# Altium schematic symbol library jlcpcb_2025_04_capacitors_extended_0805.schlib: 3281 symbols (part 5 of 18)
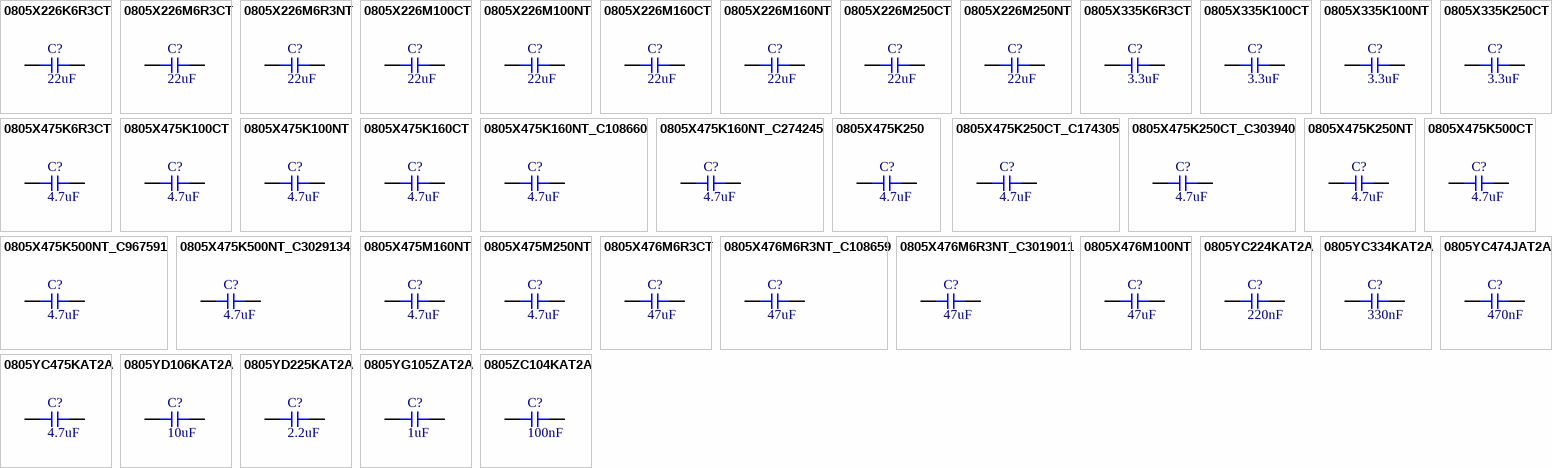
[diagram p86: symbols 0805X226K6R3CT to 0805ZC104KAT2A]

## 0805ZC104KAT2A
designator C?  Capacitance: 100nF  (hidden comment: *)
Capacitor, Ceramic (MLCC), 100nF, ±10%, 10V, X7R, ±10%, SMD 0805; Manufacturer: AVX; Manufacturer Part Number: 0805ZC104KAT2A; Package Size: 0805; JLCPCB Basic Part: No; JLCPCB Part Number: C597440; Supplier 1: LCSC; Category: Capacitors - MLCC; Supplier Part Number 1: C597440; Tolerance: ±10%; Voltage Rating: 10V; Temperature Coefficient: X7R; RoHS: Yes; ComponentLink1Description: Datasheet; ComponentLink1URL: https://wmsc.lcsc.com/wmsc/upload/file/pdf/v2/lcsc/2304140030_Kyocera-AVX-0805ZC104KAT2A_C597440.pdf; ComponentLink2Description: JLCPCB Part URL; ComponentLink2URL: https://jlcpcb.com/partdetail/C597440; ComponentLink3Description: LCSC Part URL; ComponentLink3URL: https://lcsc.com/product-detail/Multilayer-Ceramic-Capacitors-MLCC---SMD-SMT_Kyocera-AVX-Kyocera-AVX-0805ZC104KAT2A_C597440.html
footprint CAP-0805 (0805 (2012M) Capacitor)
pins: 1, 2

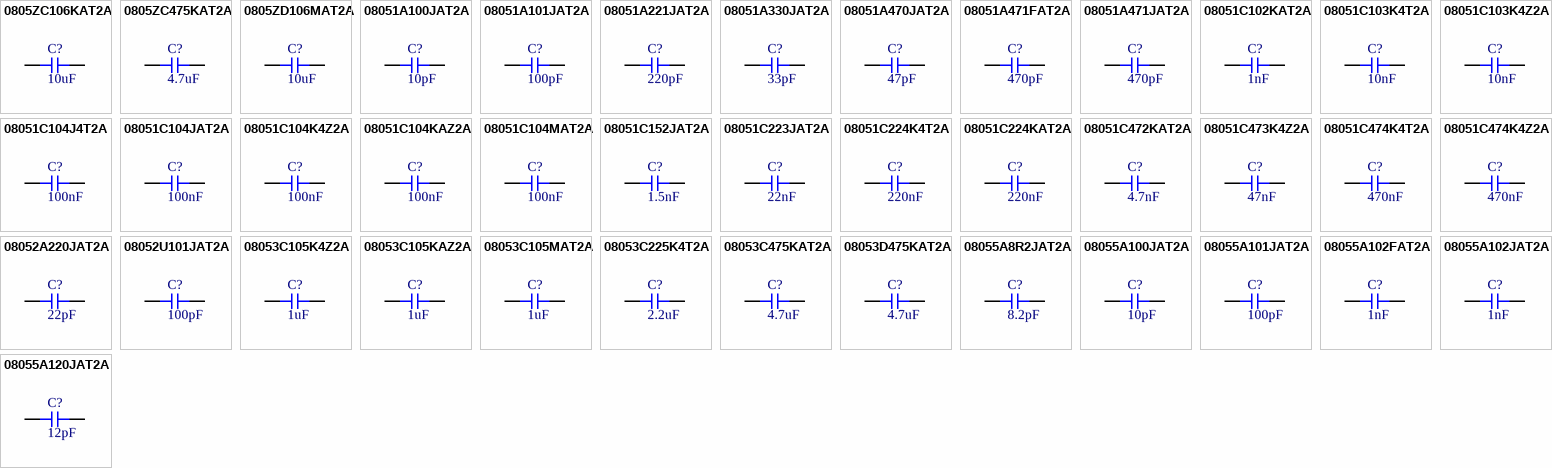
[diagram p18: symbols 0805ZC106KAT2A to 08055A120JAT2A]

## 0805ZC106KAT2A
designator C?  Capacitance: 10uF  (hidden comment: *)
Capacitor, Ceramic (MLCC), 10uF, ±10%, 10V, X7R, ±10%, SMD 0805; Manufacturer: AVX; Manufacturer Part Number: 0805ZC106KAT2A; Package Size: 0805; JLCPCB Basic Part: No; JLCPCB Part Number: C597442; Supplier 1: LCSC; Category: Capacitors - MLCC; Supplier Part Number 1: C597442; Tolerance: ±10%; Voltage Rating: 10V; Temperature Coefficient: X7R; RoHS: Yes; ComponentLink1Description: Datasheet; ComponentLink1URL: https://wmsc.lcsc.com/wmsc/upload/file/pdf/v2/lcsc/2304140030_Kyocera-AVX-0805ZC106KAT2A_C597442.pdf; ComponentLink2Description: JLCPCB Part URL; ComponentLink2URL: https://jlcpcb.com/partdetail/C597442; ComponentLink3Description: LCSC Part URL; ComponentLink3URL: https://lcsc.com/product-detail/Multilayer-Ceramic-Capacitors-MLCC---SMD-SMT_Kyocera-AVX-Kyocera-AVX-0805ZC106KAT2A_C597442.html
footprint CAP-0805 (0805 (2012M) Capacitor)
pins: 1, 2

## 0805ZC475KAT2A
designator C?  Capacitance: 4.7uF  (hidden comment: *)
Capacitor, Ceramic (MLCC), 4.7uF, ±10%, 10V, X7R, ±10%, SMD 0805; Manufacturer: Kyocera AVX; Manufacturer Part Number: 0805ZC475KAT2A; Package Size: 0805; JLCPCB Basic Part: No; JLCPCB Part Number: C2167587; Supplier 1: LCSC; Category: Capacitors - MLCC; Supplier Part Number 1: C2167587; Tolerance: ±10%; Voltage Rating: 10V; Temperature Coefficient: X7R; RoHS: Yes; ComponentLink1Description: Datasheet; ComponentLink1URL: https://wmsc.lcsc.com/wmsc/upload/file/pdf/v2/lcsc/2304140030_Kyocera-AVX-0805ZC475KAT2A_C2167587.pdf; ComponentLink2Description: JLCPCB Part URL; ComponentLink2URL: https://jlcpcb.com/partdetail/C2167587; ComponentLink3Description: LCSC Part URL; ComponentLink3URL: https://lcsc.com/product-detail/Multilayer-Ceramic-Capacitors-MLCC---SMD-SMT_Kyocera-AVX-Kyocera-AVX-0805ZC475KAT2A_C2167587.html
footprint CAP-0805 (0805 (2012M) Capacitor)
pins: 1, 2

## 0805ZD106MAT2A
designator C?  Capacitance: 10uF  (hidden comment: *)
Capacitor, Ceramic (MLCC), 10uF, ±20%, 10V, X5R, ±20%, SMD 0805; Manufacturer: Kyocera AVX; Manufacturer Part Number: 0805ZD106MAT2A; Package Size: 0805; JLCPCB Basic Part: No; JLCPCB Part Number: C2170995; Supplier 1: LCSC; Category: Capacitors - MLCC; Supplier Part Number 1: C2170995; Tolerance: ±20%; Voltage Rating: 10V; Temperature Coefficient: X5R; RoHS: Yes; ComponentLink1Description: Datasheet; ComponentLink1URL: https://wmsc.lcsc.com/wmsc/upload/file/pdf/v2/lcsc/2304140030_Kyocera-AVX-0805ZD106MAT2A_C2170995.pdf; ComponentLink2Description: JLCPCB Part URL; ComponentLink2URL: https://jlcpcb.com/partdetail/C2170995; ComponentLink3Description: LCSC Part URL; ComponentLink3URL: https://lcsc.com/product-detail/Multilayer-Ceramic-Capacitors-MLCC---SMD-SMT_Kyocera-AVX-Kyocera-AVX-0805ZD106MAT2A_C2170995.html
footprint CAP-0805 (0805 (2012M) Capacitor)
pins: 1, 2

## 08051A100JAT2A
designator C?  Capacitance: 10pF  (hidden comment: *)
Capacitor, Ceramic (MLCC), 10pF, ±5%, 100V, C0G, ±5%, SMD 0805; Manufacturer: AVX; Manufacturer Part Number: 08051A100JAT2A; Package Size: 0805; JLCPCB Basic Part: No; JLCPCB Part Number: C597259; Supplier 1: LCSC; Category: Capacitors - MLCC; Supplier Part Number 1: C597259; Tolerance: ±5%; Voltage Rating: 100V; Temperature Coefficient: C0G; RoHS: Yes; ComponentLink1Description: Datasheet; ComponentLink1URL: https://wmsc.lcsc.com/wmsc/upload/file/pdf/v2/lcsc/2304140030_Kyocera-AVX-08051A100JAT2A_C597259.pdf; ComponentLink2Description: JLCPCB Part URL; ComponentLink2URL: https://jlcpcb.com/partdetail/C597259; ComponentLink3Description: LCSC Part URL; ComponentLink3URL: https://lcsc.com/product-detail/Multilayer-Ceramic-Capacitors-MLCC---SMD-SMT_Kyocera-AVX-Kyocera-AVX-08051A100JAT2A_C597259.html
footprint CAP-0805 (0805 (2012M) Capacitor)
pins: 1, 2

## 08051A101JAT2A
designator C?  Capacitance: 100pF  (hidden comment: *)
Capacitor, Ceramic (MLCC), 100pF, ±5%, 100V, C0G, ±5%, SMD 0805; Manufacturer: AVX; Manufacturer Part Number: 08051A101JAT2A; Package Size: 0805; JLCPCB Basic Part: No; JLCPCB Part Number: C597261; Supplier 1: LCSC; Category: Capacitors - MLCC; Supplier Part Number 1: C597261; Tolerance: ±5%; Voltage Rating: 100V; Temperature Coefficient: C0G; RoHS: Yes; ComponentLink1Description: Datasheet; ComponentLink1URL: https://wmsc.lcsc.com/wmsc/upload/file/pdf/v2/lcsc/2304140030_Kyocera-AVX-08051A101JAT2A_C597261.pdf; ComponentLink2Description: JLCPCB Part URL; ComponentLink2URL: https://jlcpcb.com/partdetail/C597261; ComponentLink3Description: LCSC Part URL; ComponentLink3URL: https://lcsc.com/product-detail/Multilayer-Ceramic-Capacitors-MLCC---SMD-SMT_Kyocera-AVX-Kyocera-AVX-08051A101JAT2A_C597261.html
footprint CAP-0805 (0805 (2012M) Capacitor)
pins: 1, 2

## 08051A221JAT2A
designator C?  Capacitance: 220pF  (hidden comment: *)
Capacitor, Ceramic (MLCC), 220pF, ±5%, 100V, C0G, ±5%, SMD 0805; Manufacturer: AVX; Manufacturer Part Number: 08051A221JAT2A; Package Size: 0805; JLCPCB Basic Part: No; JLCPCB Part Number: C597269; Supplier 1: LCSC; Category: Capacitors - MLCC; Supplier Part Number 1: C597269; Tolerance: ±5%; Voltage Rating: 100V; Temperature Coefficient: C0G; RoHS: Yes; ComponentLink1Description: Datasheet; ComponentLink1URL: https://wmsc.lcsc.com/wmsc/upload/file/pdf/v2/lcsc/2304140030_Kyocera-AVX-08051A221JAT2A_C597269.pdf; ComponentLink2Description: JLCPCB Part URL; ComponentLink2URL: https://jlcpcb.com/partdetail/C597269; ComponentLink3Description: LCSC Part URL; ComponentLink3URL: https://lcsc.com/product-detail/Multilayer-Ceramic-Capacitors-MLCC---SMD-SMT_Kyocera-AVX-Kyocera-AVX-08051A221JAT2A_C597269.html
footprint CAP-0805 (0805 (2012M) Capacitor)
pins: 1, 2

## 08051A330JAT2A
designator C?  Capacitance: 33pF  (hidden comment: *)
Capacitor, Ceramic (MLCC), 33pF, ±5%, 100V, C0G, ±5%, SMD 0805; Manufacturer: AVX; Manufacturer Part Number: 08051A330JAT2A; Package Size: 0805; JLCPCB Basic Part: No; JLCPCB Part Number: C597273; Supplier 1: LCSC; Category: Capacitors - MLCC; Supplier Part Number 1: C597273; Tolerance: ±5%; Voltage Rating: 100V; Temperature Coefficient: C0G; RoHS: Yes; ComponentLink1Description: Datasheet; ComponentLink1URL: https://wmsc.lcsc.com/wmsc/upload/file/pdf/v2/lcsc/2304140030_Kyocera-AVX-08051A330JAT2A_C597273.pdf; ComponentLink2Description: JLCPCB Part URL; ComponentLink2URL: https://jlcpcb.com/partdetail/C597273; ComponentLink3Description: LCSC Part URL; ComponentLink3URL: https://lcsc.com/product-detail/Multilayer-Ceramic-Capacitors-MLCC---SMD-SMT_Kyocera-AVX-Kyocera-AVX-08051A330JAT2A_C597273.html
footprint CAP-0805 (0805 (2012M) Capacitor)
pins: 1, 2

## 08051A470JAT2A
designator C?  Capacitance: 47pF  (hidden comment: *)
Capacitor, Ceramic (MLCC), 47pF, ±5%, 100V, C0G, ±5%, SMD 0805; Manufacturer: AVX; Manufacturer Part Number: 08051A470JAT2A; Package Size: 0805; JLCPCB Basic Part: No; JLCPCB Part Number: C597277; Supplier 1: LCSC; Category: Capacitors - MLCC; Supplier Part Number 1: C597277; Tolerance: ±5%; Voltage Rating: 100V; Temperature Coefficient: C0G; RoHS: Yes; ComponentLink1Description: Datasheet; ComponentLink1URL: https://wmsc.lcsc.com/wmsc/upload/file/pdf/v2/lcsc/2304140030_Kyocera-AVX-08051A470JAT2A_C597277.pdf; ComponentLink2Description: JLCPCB Part URL; ComponentLink2URL: https://jlcpcb.com/partdetail/C597277; ComponentLink3Description: LCSC Part URL; ComponentLink3URL: https://lcsc.com/product-detail/Multilayer-Ceramic-Capacitors-MLCC---SMD-SMT_Kyocera-AVX-Kyocera-AVX-08051A470JAT2A_C597277.html
footprint CAP-0805 (0805 (2012M) Capacitor)
pins: 1, 2

## 08051A471FAT2A
designator C?  Capacitance: 470pF  (hidden comment: *)
Capacitor, Ceramic (MLCC), 470pF, ±1%, 100V, C0G, ±1%, SMD 0805; Manufacturer: Kyocera AVX; Manufacturer Part Number: 08051A471FAT2A; Package Size: 0805; JLCPCB Basic Part: No; JLCPCB Part Number: C2167779; Supplier 1: LCSC; Category: Capacitors - MLCC; Supplier Part Number 1: C2167779; Tolerance: ±1%; Voltage Rating: 100V; Temperature Coefficient: C0G; RoHS: Yes; ComponentLink1Description: Datasheet; ComponentLink1URL: https://wmsc.lcsc.com/wmsc/upload/file/pdf/v2/lcsc/2304140030_Kyocera-AVX-08051A471FAT2A_C2167779.pdf; ComponentLink2Description: JLCPCB Part URL; ComponentLink2URL: https://jlcpcb.com/partdetail/C2167779; ComponentLink3Description: LCSC Part URL; ComponentLink3URL: https://lcsc.com/product-detail/Multilayer-Ceramic-Capacitors-MLCC---SMD-SMT_Kyocera-AVX-Kyocera-AVX-08051A471FAT2A_C2167779.html
footprint CAP-0805 (0805 (2012M) Capacitor)
pins: 1, 2

## 08051A471JAT2A
designator C?  Capacitance: 470pF  (hidden comment: *)
Capacitor, Ceramic (MLCC), 470pF, ±5%, 100V, C0G, ±5%, SMD 0805; Manufacturer: AVX; Manufacturer Part Number: 08051A471JAT2A; Package Size: 0805; JLCPCB Basic Part: No; JLCPCB Part Number: C597278; Supplier 1: LCSC; Category: Capacitors - MLCC; Supplier Part Number 1: C597278; Tolerance: ±5%; Voltage Rating: 100V; Temperature Coefficient: C0G; RoHS: Yes; ComponentLink1Description: Datasheet; ComponentLink1URL: https://wmsc.lcsc.com/wmsc/upload/file/pdf/v2/lcsc/2304140030_Kyocera-AVX-08051A471JAT2A_C597278.pdf; ComponentLink2Description: JLCPCB Part URL; ComponentLink2URL: https://jlcpcb.com/partdetail/C597278; ComponentLink3Description: LCSC Part URL; ComponentLink3URL: https://lcsc.com/product-detail/Multilayer-Ceramic-Capacitors-MLCC---SMD-SMT_Kyocera-AVX-Kyocera-AVX-08051A471JAT2A_C597278.html
footprint CAP-0805 (0805 (2012M) Capacitor)
pins: 1, 2

## 08051C102KAT2A
designator C?  Capacitance: 1nF  (hidden comment: *)
Capacitor, Ceramic (MLCC), 1nF, ±10%, 100V, X7R, ±10%, SMD 0805; Manufacturer: AVX; Manufacturer Part Number: 08051C102KAT2A; Package Size: 0805; JLCPCB Basic Part: No; JLCPCB Part Number: C597284; Supplier 1: LCSC; Category: Capacitors - MLCC; Supplier Part Number 1: C597284; Tolerance: ±10%; Voltage Rating: 100V; Temperature Coefficient: X7R; RoHS: Yes; ComponentLink1Description: Datasheet; ComponentLink1URL: https://wmsc.lcsc.com/wmsc/upload/file/pdf/v2/lcsc/2304140030_Kyocera-AVX-08051C102KAT2A_C597284.pdf; ComponentLink2Description: JLCPCB Part URL; ComponentLink2URL: https://jlcpcb.com/partdetail/C597284; ComponentLink3Description: LCSC Part URL; ComponentLink3URL: https://lcsc.com/product-detail/Multilayer-Ceramic-Capacitors-MLCC---SMD-SMT_Kyocera-AVX-Kyocera-AVX-08051C102KAT2A_C597284.html
footprint CAP-0805 (0805 (2012M) Capacitor)
pins: 1, 2

## 08051C103K4T2A
designator C?  Capacitance: 10nF  (hidden comment: *)
Capacitor, Ceramic (MLCC), 10nF, ±10%, 100V, X7R, ±10%, SMD 0805; Manufacturer: AVX; Manufacturer Part Number: 08051C103K4T2A; Package Size: 0805; JLCPCB Basic Part: No; JLCPCB Part Number: C779976; Supplier 1: LCSC; Category: Capacitors - MLCC; Supplier Part Number 1: C779976; Tolerance: ±10%; Voltage Rating: 100V; Temperature Coefficient: X7R; RoHS: Yes; ComponentLink1Description: Datasheet; ComponentLink1URL: https://wmsc.lcsc.com/wmsc/upload/file/pdf/v2/lcsc/2304140030_Kyocera-AVX-08051C103K4T2A_C779976.pdf; ComponentLink2Description: JLCPCB Part URL; ComponentLink2URL: https://jlcpcb.com/partdetail/C779976; ComponentLink3Description: LCSC Part URL; ComponentLink3URL: https://lcsc.com/product-detail/Multilayer-Ceramic-Capacitors-MLCC---SMD-SMT_Kyocera-AVX-Kyocera-AVX-08051C103K4T2A_C779976.html
footprint CAP-0805 (0805 (2012M) Capacitor)
pins: 1, 2

## 08051C103K4Z2A
designator C?  Capacitance: 10nF  (hidden comment: *)
Capacitor, Ceramic (MLCC), 10nF, ±10%, 100V, X7R, ±10%, SMD 0805; Manufacturer: Kyocera AVX; Manufacturer Part Number: 08051C103K4Z2A; Package Size: 0805; JLCPCB Basic Part: No; JLCPCB Part Number: C779982; Supplier 1: LCSC; Category: Capacitors - MLCC; Supplier Part Number 1: C779982; Tolerance: ±10%; Voltage Rating: 100V; Temperature Coefficient: X7R; RoHS: Yes; ComponentLink1Description: Datasheet; ComponentLink1URL: https://wmsc.lcsc.com/wmsc/upload/file/pdf/v2/lcsc/2304140030_Kyocera-AVX-08051C103K4Z2A_C779982.pdf; ComponentLink2Description: JLCPCB Part URL; ComponentLink2URL: https://jlcpcb.com/partdetail/C779982; ComponentLink3Description: LCSC Part URL; ComponentLink3URL: https://lcsc.com/product-detail/Multilayer-Ceramic-Capacitors-MLCC---SMD-SMT_Kyocera-AVX-Kyocera-AVX-08051C103K4Z2A_C779982.html
footprint CAP-0805 (0805 (2012M) Capacitor)
pins: 1, 2

## 08051C104J4T2A
designator C?  Capacitance: 100nF  (hidden comment: *)
Capacitor, Ceramic (MLCC), 100nF, ±5%, 100V, X7R, ±5%, SMD 0805; Manufacturer: AVX; Manufacturer Part Number: 08051C104J4T2A; Package Size: 0805; JLCPCB Basic Part: No; JLCPCB Part Number: C597286; Supplier 1: LCSC; Category: Capacitors - MLCC; Supplier Part Number 1: C597286; Tolerance: ±5%; Voltage Rating: 100V; Temperature Coefficient: X7R; RoHS: Yes; ComponentLink1Description: Datasheet; ComponentLink1URL: https://wmsc.lcsc.com/wmsc/upload/file/pdf/v2/lcsc/2304140030_Kyocera-AVX-08051C104J4T2A_C597286.pdf; ComponentLink2Description: JLCPCB Part URL; ComponentLink2URL: https://jlcpcb.com/partdetail/C597286; ComponentLink3Description: LCSC Part URL; ComponentLink3URL: https://lcsc.com/product-detail/Multilayer-Ceramic-Capacitors-MLCC---SMD-SMT_Kyocera-AVX-Kyocera-AVX-08051C104J4T2A_C597286.html
footprint CAP-0805 (0805 (2012M) Capacitor)
pins: 1, 2

## 08051C104JAT2A
designator C?  Capacitance: 100nF  (hidden comment: *)
Capacitor, Ceramic (MLCC), 100nF, ±5%, 100V, X7R, ±5%, SMD 0805; Manufacturer: AVX; Manufacturer Part Number: 08051C104JAT2A; Package Size: 0805; JLCPCB Basic Part: No; JLCPCB Part Number: C597287; Supplier 1: LCSC; Category: Capacitors - MLCC; Supplier Part Number 1: C597287; Tolerance: ±5%; Voltage Rating: 100V; Temperature Coefficient: X7R; RoHS: Yes; ComponentLink1Description: Datasheet; ComponentLink1URL: https://wmsc.lcsc.com/wmsc/upload/file/pdf/v2/lcsc/2304140030_Kyocera-AVX-08051C104JAT2A_C597287.pdf; ComponentLink2Description: JLCPCB Part URL; ComponentLink2URL: https://jlcpcb.com/partdetail/C597287; ComponentLink3Description: LCSC Part URL; ComponentLink3URL: https://lcsc.com/product-detail/Multilayer-Ceramic-Capacitors-MLCC---SMD-SMT_Kyocera-AVX-Kyocera-AVX-08051C104JAT2A_C597287.html
footprint CAP-0805 (0805 (2012M) Capacitor)
pins: 1, 2

## 08051C104K4Z2A
designator C?  Capacitance: 100nF  (hidden comment: *)
Capacitor, Ceramic (MLCC), 100nF, ±10%, 100V, X7R, ±10%, SMD 0805; Manufacturer: AVX; Manufacturer Part Number: 08051C104K4Z2A; Package Size: 0805; JLCPCB Basic Part: No; JLCPCB Part Number: C597289; Supplier 1: LCSC; Category: Capacitors - MLCC; Supplier Part Number 1: C597289; Tolerance: ±10%; Voltage Rating: 100V; Temperature Coefficient: X7R; RoHS: Yes; ComponentLink1Description: Datasheet; ComponentLink1URL: https://wmsc.lcsc.com/wmsc/upload/file/pdf/v2/lcsc/2304140030_Kyocera-AVX-08051C104K4Z2A_C597289.pdf; ComponentLink2Description: JLCPCB Part URL; ComponentLink2URL: https://jlcpcb.com/partdetail/C597289; ComponentLink3Description: LCSC Part URL; ComponentLink3URL: https://lcsc.com/product-detail/Multilayer-Ceramic-Capacitors-MLCC---SMD-SMT_Kyocera-AVX-Kyocera-AVX-08051C104K4Z2A_C597289.html
footprint CAP-0805 (0805 (2012M) Capacitor)
pins: 1, 2

## 08051C104KAZ2A
designator C?  Capacitance: 100nF  (hidden comment: *)
Capacitor, Ceramic (MLCC), 100nF, ±10%, 100V, X7R, ±10%, SMD 0805; Manufacturer: AVX; Manufacturer Part Number: 08051C104KAZ2A; Package Size: 0805; JLCPCB Basic Part: No; JLCPCB Part Number: C597291; Supplier 1: LCSC; Category: Capacitors - MLCC; Supplier Part Number 1: C597291; Tolerance: ±10%; Voltage Rating: 100V; Temperature Coefficient: X7R; RoHS: Yes; ComponentLink1Description: Datasheet; ComponentLink1URL: https://wmsc.lcsc.com/wmsc/upload/file/pdf/v2/lcsc/2304140030_Kyocera-AVX-08051C104KAZ2A_C597291.pdf; ComponentLink2Description: JLCPCB Part URL; ComponentLink2URL: https://jlcpcb.com/partdetail/C597291; ComponentLink3Description: LCSC Part URL; ComponentLink3URL: https://lcsc.com/product-detail/Multilayer-Ceramic-Capacitors-MLCC---SMD-SMT_Kyocera-AVX-Kyocera-AVX-08051C104KAZ2A_C597291.html
footprint CAP-0805 (0805 (2012M) Capacitor)
pins: 1, 2

## 08051C104MAT2A
designator C?  Capacitance: 100nF  (hidden comment: *)
Capacitor, Ceramic (MLCC), 100nF, ±20%, 100V, X7R, ±20%, SMD 0805; Manufacturer: Kyocera AVX; Manufacturer Part Number: 08051C104MAT2A; Package Size: 0805; JLCPCB Basic Part: No; JLCPCB Part Number: C2169663; Supplier 1: LCSC; Category: Capacitors - MLCC; Supplier Part Number 1: C2169663; Tolerance: ±20%; Voltage Rating: 100V; Temperature Coefficient: X7R; RoHS: Yes; ComponentLink1Description: Datasheet; ComponentLink1URL: https://wmsc.lcsc.com/wmsc/upload/file/pdf/v2/lcsc/2304140030_Kyocera-AVX-08051C104MAT2A_C2169663.pdf; ComponentLink2Description: JLCPCB Part URL; ComponentLink2URL: https://jlcpcb.com/partdetail/C2169663; ComponentLink3Description: LCSC Part URL; ComponentLink3URL: https://lcsc.com/product-detail/Multilayer-Ceramic-Capacitors-MLCC---SMD-SMT_Kyocera-AVX-Kyocera-AVX-08051C104MAT2A_C2169663.html
footprint CAP-0805 (0805 (2012M) Capacitor)
pins: 1, 2

## 08051C152JAT2A
designator C?  Capacitance: 1.5nF  (hidden comment: *)
Capacitor, Ceramic (MLCC), 1.5nF, ±5%, 100V, X7R, ±5%, SMD 0805; Manufacturer: Kyocera AVX; Manufacturer Part Number: 08051C152JAT2A; Package Size: 0805; JLCPCB Basic Part: No; JLCPCB Part Number: C2170583; Supplier 1: LCSC; Category: Capacitors - MLCC; Supplier Part Number 1: C2170583; Tolerance: ±5%; Voltage Rating: 100V; Temperature Coefficient: X7R; RoHS: Yes; ComponentLink1Description: Datasheet; ComponentLink1URL: https://wmsc.lcsc.com/wmsc/upload/file/pdf/v2/lcsc/2304140030_Kyocera-AVX-08051C152JAT2A_C2170583.pdf; ComponentLink2Description: JLCPCB Part URL; ComponentLink2URL: https://jlcpcb.com/partdetail/C2170583; ComponentLink3Description: LCSC Part URL; ComponentLink3URL: https://lcsc.com/product-detail/Multilayer-Ceramic-Capacitors-MLCC---SMD-SMT_Kyocera-AVX-Kyocera-AVX-08051C152JAT2A_C2170583.html
footprint CAP-0805 (0805 (2012M) Capacitor)
pins: 1, 2

## 08051C223JAT2A
designator C?  Capacitance: 22nF  (hidden comment: *)
Capacitor, Ceramic (MLCC), 22nF, ±5%, 100V, X7R, ±5%, SMD 0805; Manufacturer: Kyocera AVX; Manufacturer Part Number: 08051C223JAT2A; Package Size: 0805; JLCPCB Basic Part: No; JLCPCB Part Number: C2181192; Supplier 1: LCSC; Category: Capacitors - MLCC; Supplier Part Number 1: C2181192; Tolerance: ±5%; Voltage Rating: 100V; Temperature Coefficient: X7R; RoHS: Yes; ComponentLink1Description: Datasheet; ComponentLink1URL: https://wmsc.lcsc.com/wmsc/upload/file/pdf/v2/lcsc/2304140030_Kyocera-AVX-08051C223JAT2A_C2181192.pdf; ComponentLink2Description: JLCPCB Part URL; ComponentLink2URL: https://jlcpcb.com/partdetail/C2181192; ComponentLink3Description: LCSC Part URL; ComponentLink3URL: https://lcsc.com/product-detail/Multilayer-Ceramic-Capacitors-MLCC---SMD-SMT_Kyocera-AVX-Kyocera-AVX-08051C223JAT2A_C2181192.html
footprint CAP-0805 (0805 (2012M) Capacitor)
pins: 1, 2

## 08051C224K4T2A
designator C?  Capacitance: 220nF  (hidden comment: *)
Capacitor, Ceramic (MLCC), 220nF, ±10%, 100V, X7R, ±10%, SMD 0805; Manufacturer: Kyocera AVX; Manufacturer Part Number: 08051C224K4T2A; Package Size: 0805; JLCPCB Basic Part: No; JLCPCB Part Number: C2176107; Supplier 1: LCSC; Category: Capacitors - MLCC; Supplier Part Number 1: C2176107; Tolerance: ±10%; Voltage Rating: 100V; Temperature Coefficient: X7R; RoHS: Yes; ComponentLink1Description: Datasheet; ComponentLink1URL: https://wmsc.lcsc.com/wmsc/upload/file/pdf/v2/lcsc/2304140030_Kyocera-AVX-08051C224K4T2A_C2176107.pdf; ComponentLink2Description: JLCPCB Part URL; ComponentLink2URL: https://jlcpcb.com/partdetail/C2176107; ComponentLink3Description: LCSC Part URL; ComponentLink3URL: https://lcsc.com/product-detail/Multilayer-Ceramic-Capacitors-MLCC---SMD-SMT_Kyocera-AVX-Kyocera-AVX-08051C224K4T2A_C2176107.html
footprint CAP-0805 (0805 (2012M) Capacitor)
pins: 1, 2

## 08051C224KAT2A
designator C?  Capacitance: 220nF  (hidden comment: *)
Capacitor, Ceramic (MLCC), 220nF, ±10%, 100V, X7R, ±10%, SMD 0805; Manufacturer: AVX; Manufacturer Part Number: 08051C224KAT2A; Package Size: 0805; JLCPCB Basic Part: No; JLCPCB Part Number: C597297; Supplier 1: LCSC; Category: Capacitors - MLCC; Supplier Part Number 1: C597297; Tolerance: ±10%; Voltage Rating: 100V; Temperature Coefficient: X7R; RoHS: Yes; ComponentLink1Description: Datasheet; ComponentLink1URL: https://wmsc.lcsc.com/wmsc/upload/file/pdf/v2/lcsc/2304140030_Kyocera-AVX-08051C224KAT2A_C597297.pdf; ComponentLink2Description: JLCPCB Part URL; ComponentLink2URL: https://jlcpcb.com/partdetail/C597297; ComponentLink3Description: LCSC Part URL; ComponentLink3URL: https://lcsc.com/product-detail/Multilayer-Ceramic-Capacitors-MLCC---SMD-SMT_Kyocera-AVX-Kyocera-AVX-08051C224KAT2A_C597297.html
footprint CAP-0805 (0805 (2012M) Capacitor)
pins: 1, 2

## 08051C472KAT2A
designator C?  Capacitance: 4.7nF  (hidden comment: *)
Capacitor, Ceramic (MLCC), 4.7nF, ±10%, 100V, X7R, ±10%, SMD 0805; Manufacturer: AVX; Manufacturer Part Number: 08051C472KAT2A; Package Size: 0805; JLCPCB Basic Part: No; JLCPCB Part Number: C597300; Supplier 1: LCSC; Category: Capacitors - MLCC; Supplier Part Number 1: C597300; Tolerance: ±10%; Voltage Rating: 100V; Temperature Coefficient: X7R; RoHS: Yes; ComponentLink1Description: Datasheet; ComponentLink1URL: https://wmsc.lcsc.com/wmsc/upload/file/pdf/v2/lcsc/2304140030_Kyocera-AVX-08051C472KAT2A_C597300.pdf; ComponentLink2Description: JLCPCB Part URL; ComponentLink2URL: https://jlcpcb.com/partdetail/C597300; ComponentLink3Description: LCSC Part URL; ComponentLink3URL: https://lcsc.com/product-detail/Multilayer-Ceramic-Capacitors-MLCC---SMD-SMT_Kyocera-AVX-Kyocera-AVX-08051C472KAT2A_C597300.html
footprint CAP-0805 (0805 (2012M) Capacitor)
pins: 1, 2

## 08051C473K4Z2A
designator C?  Capacitance: 47nF  (hidden comment: *)
Capacitor, Ceramic (MLCC), 47nF, ±10%, 100V, X7R, ±10%, SMD 0805; Manufacturer: AVX; Manufacturer Part Number: 08051C473K4Z2A; Package Size: 0805; JLCPCB Basic Part: No; JLCPCB Part Number: C597301; Supplier 1: LCSC; Category: Capacitors - MLCC; Supplier Part Number 1: C597301; Tolerance: ±10%; Voltage Rating: 100V; Temperature Coefficient: X7R; RoHS: Yes; ComponentLink1Description: Datasheet; ComponentLink1URL: https://wmsc.lcsc.com/wmsc/upload/file/pdf/v2/lcsc/2304140030_Kyocera-AVX-08051C473K4Z2A_C597301.pdf; ComponentLink2Description: JLCPCB Part URL; ComponentLink2URL: https://jlcpcb.com/partdetail/C597301; ComponentLink3Description: LCSC Part URL; ComponentLink3URL: https://lcsc.com/product-detail/Multilayer-Ceramic-Capacitors-MLCC---SMD-SMT_Kyocera-AVX-Kyocera-AVX-08051C473K4Z2A_C597301.html
footprint CAP-0805 (0805 (2012M) Capacitor)
pins: 1, 2

## 08051C474K4T2A
designator C?  Capacitance: 470nF  (hidden comment: *)
Capacitor, Ceramic (MLCC), 470nF, ±10%, 100V, X7R, ±10%, SMD 0805; Manufacturer: AVX; Manufacturer Part Number: 08051C474K4T2A; Package Size: 0805; JLCPCB Basic Part: No; JLCPCB Part Number: C779995; Supplier 1: LCSC; Category: Capacitors - MLCC; Supplier Part Number 1: C779995; Tolerance: ±10%; Voltage Rating: 100V; Temperature Coefficient: X7R; RoHS: Yes; ComponentLink1Description: Datasheet; ComponentLink1URL: https://wmsc.lcsc.com/wmsc/upload/file/pdf/v2/lcsc/2304140030_Kyocera-AVX-08051C474K4T2A_C779995.pdf; ComponentLink2Description: JLCPCB Part URL; ComponentLink2URL: https://jlcpcb.com/partdetail/C779995; ComponentLink3Description: LCSC Part URL; ComponentLink3URL: https://lcsc.com/product-detail/Multilayer-Ceramic-Capacitors-MLCC---SMD-SMT_Kyocera-AVX-Kyocera-AVX-08051C474K4T2A_C779995.html
footprint CAP-0805 (0805 (2012M) Capacitor)
pins: 1, 2

## 08051C474K4Z2A
designator C?  Capacitance: 470nF  (hidden comment: *)
Capacitor, Ceramic (MLCC), 470nF, ±10%, 100V, X7R, ±10%, SMD 0805; Manufacturer: AVX; Manufacturer Part Number: 08051C474K4Z2A; Package Size: 0805; JLCPCB Basic Part: No; JLCPCB Part Number: C597303; Supplier 1: LCSC; Category: Capacitors - MLCC; Supplier Part Number 1: C597303; Tolerance: ±10%; Voltage Rating: 100V; Temperature Coefficient: X7R; RoHS: Yes; ComponentLink1Description: Datasheet; ComponentLink1URL: https://wmsc.lcsc.com/wmsc/upload/file/pdf/v2/lcsc/2304140030_Kyocera-AVX-08051C474K4Z2A_C597303.pdf; ComponentLink2Description: JLCPCB Part URL; ComponentLink2URL: https://jlcpcb.com/partdetail/C597303; ComponentLink3Description: LCSC Part URL; ComponentLink3URL: https://lcsc.com/product-detail/Multilayer-Ceramic-Capacitors-MLCC---SMD-SMT_Kyocera-AVX-Kyocera-AVX-08051C474K4Z2A_C597303.html
footprint CAP-0805 (0805 (2012M) Capacitor)
pins: 1, 2

## 08052A220JAT2A
designator C?  Capacitance: 22pF  (hidden comment: *)
Capacitor, Ceramic (MLCC), 22pF, ±5%, 200V, C0G, ±5%, SMD 0805; Manufacturer: AVX; Manufacturer Part Number: 08052A220JAT2A; Package Size: 0805; JLCPCB Basic Part: No; JLCPCB Part Number: C597311; Supplier 1: LCSC; Category: Capacitors - MLCC; Supplier Part Number 1: C597311; Tolerance: ±5%; Voltage Rating: 200V; Temperature Coefficient: C0G; RoHS: Yes; ComponentLink1Description: Datasheet; ComponentLink1URL: https://wmsc.lcsc.com/wmsc/upload/file/pdf/v2/lcsc/2304140030_Kyocera-AVX-08052A220JAT2A_C597311.pdf; ComponentLink2Description: JLCPCB Part URL; ComponentLink2URL: https://jlcpcb.com/partdetail/C597311; ComponentLink3Description: LCSC Part URL; ComponentLink3URL: https://lcsc.com/product-detail/Multilayer-Ceramic-Capacitors-MLCC---SMD-SMT_Kyocera-AVX-Kyocera-AVX-08052A220JAT2A_C597311.html
footprint CAP-0805 (0805 (2012M) Capacitor)
pins: 1, 2

## 08052U101JAT2A
designator C?  Capacitance: 100pF  (hidden comment: *)
Capacitor, Ceramic (MLCC), 100pF, ±5%, 200V, C0G, ±5%, SMD 0805; Manufacturer: AVX; Manufacturer Part Number: 08052U101JAT2A; Package Size: 0805; JLCPCB Basic Part: No; JLCPCB Part Number: C597325; Supplier 1: LCSC; Category: Capacitors - MLCC; Supplier Part Number 1: C597325; Tolerance: ±5%; Voltage Rating: 200V; Temperature Coefficient: C0G; RoHS: Yes; ComponentLink1Description: Datasheet; ComponentLink1URL: https://wmsc.lcsc.com/wmsc/upload/file/pdf/v2/lcsc/2304140030_Kyocera-AVX-08052U101JAT2A_C597325.pdf; ComponentLink2Description: JLCPCB Part URL; ComponentLink2URL: https://jlcpcb.com/partdetail/C597325; ComponentLink3Description: LCSC Part URL; ComponentLink3URL: https://lcsc.com/product-detail/Multilayer-Ceramic-Capacitors-MLCC---SMD-SMT_Kyocera-AVX-Kyocera-AVX-08052U101JAT2A_C597325.html
footprint CAP-0805 (0805 (2012M) Capacitor)
pins: 1, 2

## 08053C105K4Z2A
designator C?  Capacitance: 1uF  (hidden comment: *)
Capacitor, Ceramic (MLCC), 1uF, ±10%, 25V, X7R, ±10%, SMD 0805; Manufacturer: AVX; Manufacturer Part Number: 08053C105K4Z2A; Package Size: 0805; JLCPCB Basic Part: No; JLCPCB Part Number: C597342; Supplier 1: LCSC; Category: Capacitors - MLCC; Supplier Part Number 1: C597342; Tolerance: ±10%; Voltage Rating: 25V; Temperature Coefficient: X7R; RoHS: Yes; ComponentLink1Description: Datasheet; ComponentLink1URL: https://wmsc.lcsc.com/wmsc/upload/file/pdf/v2/lcsc/2304140030_Kyocera-AVX-08053C105K4Z2A_C597342.pdf; ComponentLink2Description: JLCPCB Part URL; ComponentLink2URL: https://jlcpcb.com/partdetail/C597342; ComponentLink3Description: LCSC Part URL; ComponentLink3URL: https://lcsc.com/product-detail/Multilayer-Ceramic-Capacitors-MLCC---SMD-SMT_Kyocera-AVX-Kyocera-AVX-08053C105K4Z2A_C597342.html
footprint CAP-0805 (0805 (2012M) Capacitor)
pins: 1, 2

## 08053C105KAZ2A
designator C?  Capacitance: 1uF  (hidden comment: *)
Capacitor, Ceramic (MLCC), 1uF, ±10%, 25V, X7R, ±10%, SMD 0805; Manufacturer: Kyocera AVX; Manufacturer Part Number: 08053C105KAZ2A; Package Size: 0805; JLCPCB Basic Part: No; JLCPCB Part Number: C2168801; Supplier 1: LCSC; Category: Capacitors - MLCC; Supplier Part Number 1: C2168801; Tolerance: ±10%; Voltage Rating: 25V; Temperature Coefficient: X7R; RoHS: Yes; ComponentLink1Description: Datasheet; ComponentLink1URL: https://wmsc.lcsc.com/wmsc/upload/file/pdf/v2/lcsc/2304140030_Kyocera-AVX-08053C105KAZ2A_C2168801.pdf; ComponentLink2Description: JLCPCB Part URL; ComponentLink2URL: https://jlcpcb.com/partdetail/C2168801; ComponentLink3Description: LCSC Part URL; ComponentLink3URL: https://lcsc.com/product-detail/Multilayer-Ceramic-Capacitors-MLCC---SMD-SMT_Kyocera-AVX-Kyocera-AVX-08053C105KAZ2A_C2168801.html
footprint CAP-0805 (0805 (2012M) Capacitor)
pins: 1, 2

## 08053C105MAT2A
designator C?  Capacitance: 1uF  (hidden comment: *)
Capacitor, Ceramic (MLCC), 1uF, ±20%, 25V, X7R, ±20%, SMD 0805; Manufacturer: Kyocera AVX; Manufacturer Part Number: 08053C105MAT2A; Package Size: 0805; JLCPCB Basic Part: No; JLCPCB Part Number: C2173371; Supplier 1: LCSC; Category: Capacitors - MLCC; Supplier Part Number 1: C2173371; Tolerance: ±20%; Voltage Rating: 25V; Temperature Coefficient: X7R; RoHS: Yes; ComponentLink1Description: Datasheet; ComponentLink1URL: https://wmsc.lcsc.com/wmsc/upload/file/pdf/v2/lcsc/2304140030_Kyocera-AVX-08053C105MAT2A_C2173371.pdf; ComponentLink2Description: JLCPCB Part URL; ComponentLink2URL: https://jlcpcb.com/partdetail/C2173371; ComponentLink3Description: LCSC Part URL; ComponentLink3URL: https://lcsc.com/product-detail/Multilayer-Ceramic-Capacitors-MLCC---SMD-SMT_Kyocera-AVX-Kyocera-AVX-08053C105MAT2A_C2173371.html
footprint CAP-0805 (0805 (2012M) Capacitor)
pins: 1, 2

## 08053C225K4T2A
designator C?  Capacitance: 2.2uF  (hidden comment: *)
Capacitor, Ceramic (MLCC), 2.2uF, ±10%, 25V, X7R, ±10%, SMD 0805; Manufacturer: Kyocera AVX; Manufacturer Part Number: 08053C225K4T2A; Package Size: 0805; JLCPCB Basic Part: No; JLCPCB Part Number: C2175866; Supplier 1: LCSC; Category: Capacitors - MLCC; Supplier Part Number 1: C2175866; Tolerance: ±10%; Voltage Rating: 25V; Temperature Coefficient: X7R; RoHS: Yes; ComponentLink1Description: Datasheet; ComponentLink1URL: https://wmsc.lcsc.com/wmsc/upload/file/pdf/v2/lcsc/2304140030_Kyocera-AVX-08053C225K4T2A_C2175866.pdf; ComponentLink2Description: JLCPCB Part URL; ComponentLink2URL: https://jlcpcb.com/partdetail/C2175866; ComponentLink3Description: LCSC Part URL; ComponentLink3URL: https://lcsc.com/product-detail/Multilayer-Ceramic-Capacitors-MLCC---SMD-SMT_Kyocera-AVX-Kyocera-AVX-08053C225K4T2A_C2175866.html
footprint CAP-0805 (0805 (2012M) Capacitor)
pins: 1, 2

## 08053C475KAT2A
designator C?  Capacitance: 4.7uF  (hidden comment: *)
Capacitor, Ceramic (MLCC), 4.7uF, ±10%, 25V, X7R, ±10%, SMD 0805; Manufacturer: AVX; Manufacturer Part Number: 08053C475KAT2A; Package Size: 0805; JLCPCB Basic Part: No; JLCPCB Part Number: C597345; Supplier 1: LCSC; Category: Capacitors - MLCC; Supplier Part Number 1: C597345; Tolerance: ±10%; Voltage Rating: 25V; Temperature Coefficient: X7R; RoHS: Yes; ComponentLink1Description: Datasheet; ComponentLink1URL: https://wmsc.lcsc.com/wmsc/upload/file/pdf/v2/lcsc/2304140030_Kyocera-AVX-08053C475KAT2A_C597345.pdf; ComponentLink2Description: JLCPCB Part URL; ComponentLink2URL: https://jlcpcb.com/partdetail/C597345; ComponentLink3Description: LCSC Part URL; ComponentLink3URL: https://lcsc.com/product-detail/Multilayer-Ceramic-Capacitors-MLCC---SMD-SMT_Kyocera-AVX-Kyocera-AVX-08053C475KAT2A_C597345.html
footprint CAP-0805 (0805 (2012M) Capacitor)
pins: 1, 2

## 08053D475KAT2A
designator C?  Capacitance: 4.7uF  (hidden comment: *)
Capacitor, Ceramic (MLCC), 4.7uF, ±10%, 25V, X5R, ±10%, SMD 0805; Manufacturer: Kyocera AVX; Manufacturer Part Number: 08053D475KAT2A; Package Size: 0805; JLCPCB Basic Part: No; JLCPCB Part Number: C165207; Supplier 1: LCSC; Category: Capacitors - MLCC; Supplier Part Number 1: C165207; Tolerance: ±10%; Voltage Rating: 25V; Temperature Coefficient: X5R; RoHS: Yes; ComponentLink1Description: Datasheet; ComponentLink1URL: https://wmsc.lcsc.com/wmsc/upload/file/pdf/v2/lcsc/2212141909_Kyocera-AVX-08053D475KAT2A_C165207.pdf; ComponentLink2Description: JLCPCB Part URL; ComponentLink2URL: https://jlcpcb.com/partdetail/C165207; ComponentLink3Description: LCSC Part URL; ComponentLink3URL: https://lcsc.com/product-detail/Multilayer-Ceramic-Capacitors-MLCC---SMD-SMT_Kyocera-AVX-Kyocera-AVX-08053D475KAT2A_C165207.html
footprint CAP-0805 (0805 (2012M) Capacitor)
pins: 1, 2

## 08055A8R2JAT2A
designator C?  Capacitance: 8.2pF  (hidden comment: *)
Capacitor, Ceramic (MLCC), 8.2pF, ±5%, 50V, C0G, ±5%, SMD 0805; Manufacturer: Kyocera AVX; Manufacturer Part Number: 08055A8R2JAT2A; Package Size: 0805; JLCPCB Basic Part: No; JLCPCB Part Number: C1856386; Supplier 1: LCSC; Category: Capacitors - MLCC; Supplier Part Number 1: C1856386; Tolerance: ±5%; Voltage Rating: 50V; Temperature Coefficient: C0G; RoHS: Yes; ComponentLink1Description: Datasheet; ComponentLink1URL: https://wmsc.lcsc.com/wmsc/upload/file/pdf/v2/lcsc/2304140030_Kyocera-AVX-08055A8R2JAT2A_C1856386.pdf; ComponentLink2Description: JLCPCB Part URL; ComponentLink2URL: https://jlcpcb.com/partdetail/C1856386; ComponentLink3Description: LCSC Part URL; ComponentLink3URL: https://lcsc.com/product-detail/Multilayer-Ceramic-Capacitors-MLCC---SMD-SMT_Kyocera-AVX-Kyocera-AVX-08055A8R2JAT2A_C1856386.html
footprint CAP-0805 (0805 (2012M) Capacitor)
pins: 1, 2

## 08055A100JAT2A
designator C?  Capacitance: 10pF  (hidden comment: *)
Capacitor, Ceramic (MLCC), 10pF, ±5%, 50V, C0G, ±5%, SMD 0805; Manufacturer: Kyocera AVX; Manufacturer Part Number: 08055A100JAT2A; Package Size: 0805; JLCPCB Basic Part: No; JLCPCB Part Number: C2170018; Supplier 1: LCSC; Category: Capacitors - MLCC; Supplier Part Number 1: C2170018; Tolerance: ±5%; Voltage Rating: 50V; Temperature Coefficient: C0G; RoHS: Yes; ComponentLink1Description: Datasheet; ComponentLink1URL: https://wmsc.lcsc.com/wmsc/upload/file/pdf/v2/lcsc/2304140030_Kyocera-AVX-08055A100JAT2A_C2170018.pdf; ComponentLink2Description: JLCPCB Part URL; ComponentLink2URL: https://jlcpcb.com/partdetail/C2170018; ComponentLink3Description: LCSC Part URL; ComponentLink3URL: https://lcsc.com/product-detail/Multilayer-Ceramic-Capacitors-MLCC---SMD-SMT_Kyocera-AVX-Kyocera-AVX-08055A100JAT2A_C2170018.html
footprint CAP-0805 (0805 (2012M) Capacitor)
pins: 1, 2

## 08055A101JAT2A
designator C?  Capacitance: 100pF  (hidden comment: *)
Capacitor, Ceramic (MLCC), 100pF, ±5%, 50V, C0G, ±5%, SMD 0805; Manufacturer: Kyocera AVX; Manufacturer Part Number: 08055A101JAT2A; Package Size: 0805; JLCPCB Basic Part: No; JLCPCB Part Number: C2167403; Supplier 1: LCSC; Category: Capacitors - MLCC; Supplier Part Number 1: C2167403; Tolerance: ±5%; Voltage Rating: 50V; Temperature Coefficient: C0G; RoHS: Yes; ComponentLink1Description: Datasheet; ComponentLink1URL: https://wmsc.lcsc.com/wmsc/upload/file/pdf/v2/lcsc/2304140030_Kyocera-AVX-08055A101JAT2A_C2167403.pdf; ComponentLink2Description: JLCPCB Part URL; ComponentLink2URL: https://jlcpcb.com/partdetail/C2167403; ComponentLink3Description: LCSC Part URL; ComponentLink3URL: https://lcsc.com/product-detail/Multilayer-Ceramic-Capacitors-MLCC---SMD-SMT_Kyocera-AVX-Kyocera-AVX-08055A101JAT2A_C2167403.html
footprint CAP-0805 (0805 (2012M) Capacitor)
pins: 1, 2

## 08055A102FAT2A
designator C?  Capacitance: 1nF  (hidden comment: *)
Capacitor, Ceramic (MLCC), 1nF, ±1%, 50V, C0G, ±1%, SMD 0805; Manufacturer: AVX; Manufacturer Part Number: 08055A102FAT2A; Package Size: 0805; JLCPCB Basic Part: No; JLCPCB Part Number: C597356; Supplier 1: LCSC; Category: Capacitors - MLCC; Supplier Part Number 1: C597356; Tolerance: ±1%; Voltage Rating: 50V; Temperature Coefficient: C0G; RoHS: Yes; ComponentLink1Description: Datasheet; ComponentLink1URL: https://wmsc.lcsc.com/wmsc/upload/file/pdf/v2/lcsc/2304140030_Kyocera-AVX-08055A102FAT2A_C597356.pdf; ComponentLink2Description: JLCPCB Part URL; ComponentLink2URL: https://jlcpcb.com/partdetail/C597356; ComponentLink3Description: LCSC Part URL; ComponentLink3URL: https://lcsc.com/product-detail/Multilayer-Ceramic-Capacitors-MLCC---SMD-SMT_Kyocera-AVX-Kyocera-AVX-08055A102FAT2A_C597356.html
footprint CAP-0805 (0805 (2012M) Capacitor)
pins: 1, 2

## 08055A102JAT2A
designator C?  Capacitance: 1nF  (hidden comment: *)
Capacitor, Ceramic (MLCC), 1nF, ±5%, 50V, C0G, ±5%, SMD 0805; Manufacturer: AVX; Manufacturer Part Number: 08055A102JAT2A; Package Size: 0805; JLCPCB Basic Part: No; JLCPCB Part Number: C597357; Supplier 1: LCSC; Category: Capacitors - MLCC; Supplier Part Number 1: C597357; Tolerance: ±5%; Voltage Rating: 50V; Temperature Coefficient: C0G; RoHS: Yes; ComponentLink1Description: Datasheet; ComponentLink1URL: https://wmsc.lcsc.com/wmsc/upload/file/pdf/v2/lcsc/2304140030_Kyocera-AVX-08055A102JAT2A_C597357.pdf; ComponentLink2Description: JLCPCB Part URL; ComponentLink2URL: https://jlcpcb.com/partdetail/C597357; ComponentLink3Description: LCSC Part URL; ComponentLink3URL: https://lcsc.com/product-detail/Multilayer-Ceramic-Capacitors-MLCC---SMD-SMT_Kyocera-AVX-Kyocera-AVX-08055A102JAT2A_C597357.html
footprint CAP-0805 (0805 (2012M) Capacitor)
pins: 1, 2

## 08055A120JAT2A
designator C?  Capacitance: 12pF  (hidden comment: *)
Capacitor, Ceramic (MLCC), 12pF, ±5%, 50V, C0G, ±5%, SMD 0805; Manufacturer: AVX; Manufacturer Part Number: 08055A120JAT2A; Package Size: 0805; JLCPCB Basic Part: No; JLCPCB Part Number: C597358; Supplier 1: LCSC; Category: Capacitors - MLCC; Supplier Part Number 1: C597358; Tolerance: ±5%; Voltage Rating: 50V; Temperature Coefficient: C0G; RoHS: Yes; ComponentLink1Description: Datasheet; ComponentLink1URL: https://wmsc.lcsc.com/wmsc/upload/file/pdf/v2/lcsc/2304140030_Kyocera-AVX-08055A120JAT2A_C597358.pdf; ComponentLink2Description: JLCPCB Part URL; ComponentLink2URL: https://jlcpcb.com/partdetail/C597358; ComponentLink3Description: LCSC Part URL; ComponentLink3URL: https://lcsc.com/product-detail/Multilayer-Ceramic-Capacitors-MLCC---SMD-SMT_Kyocera-AVX-Kyocera-AVX-08055A120JAT2A_C597358.html
footprint CAP-0805 (0805 (2012M) Capacitor)
pins: 1, 2

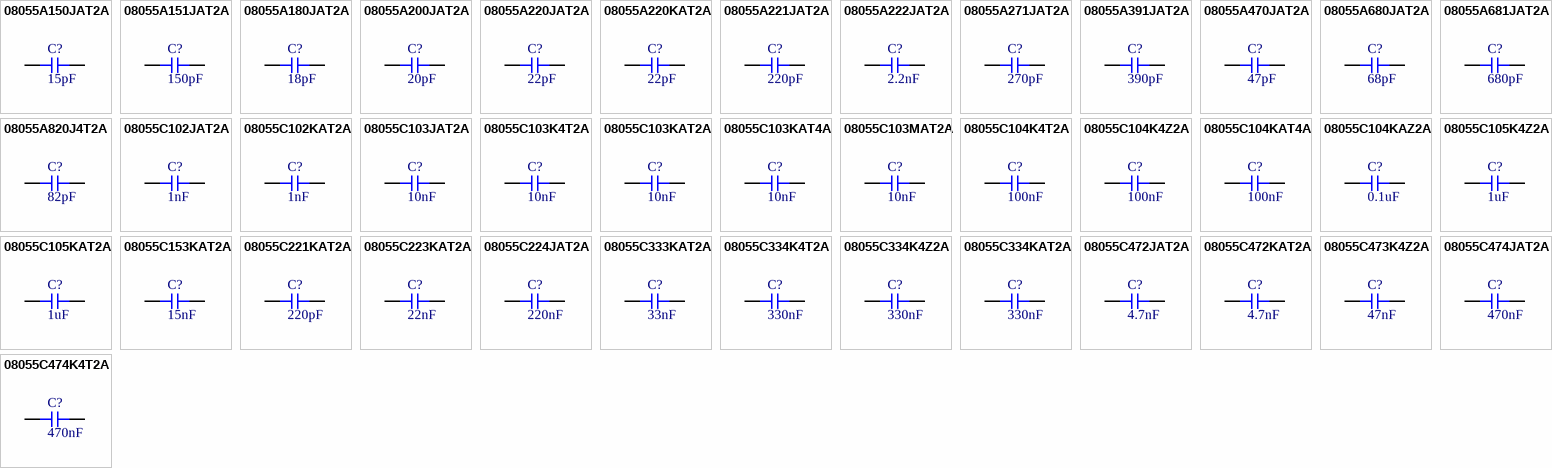
[diagram p19: symbols 08055A150JAT2A to 08055C474K4T2A]

## 08055A150JAT2A
designator C?  Capacitance: 15pF  (hidden comment: *)
Capacitor, Ceramic (MLCC), 15pF, ±5%, 50V, C0G, ±5%, SMD 0805; Manufacturer: AVX; Manufacturer Part Number: 08055A150JAT2A; Package Size: 0805; JLCPCB Basic Part: No; JLCPCB Part Number: C597359; Supplier 1: LCSC; Category: Capacitors - MLCC; Supplier Part Number 1: C597359; Tolerance: ±5%; Voltage Rating: 50V; Temperature Coefficient: C0G; RoHS: Yes; ComponentLink1Description: Datasheet; ComponentLink1URL: https://wmsc.lcsc.com/wmsc/upload/file/pdf/v2/lcsc/2304140030_Kyocera-AVX-08055A150JAT2A_C597359.pdf; ComponentLink2Description: JLCPCB Part URL; ComponentLink2URL: https://jlcpcb.com/partdetail/C597359; ComponentLink3Description: LCSC Part URL; ComponentLink3URL: https://lcsc.com/product-detail/Multilayer-Ceramic-Capacitors-MLCC---SMD-SMT_Kyocera-AVX-Kyocera-AVX-08055A150JAT2A_C597359.html
footprint CAP-0805 (0805 (2012M) Capacitor)
pins: 1, 2

## 08055A151JAT2A
designator C?  Capacitance: 150pF  (hidden comment: *)
Capacitor, Ceramic (MLCC), 150pF, ±5%, 50V, C0G, ±5%, SMD 0805; Manufacturer: Kyocera AVX; Manufacturer Part Number: 08055A151JAT2A; Package Size: 0805; JLCPCB Basic Part: No; JLCPCB Part Number: C2180927; Supplier 1: LCSC; Category: Capacitors - MLCC; Supplier Part Number 1: C2180927; Tolerance: ±5%; Voltage Rating: 50V; Temperature Coefficient: C0G; RoHS: Yes; ComponentLink1Description: Datasheet; ComponentLink1URL: https://wmsc.lcsc.com/wmsc/upload/file/pdf/v2/lcsc/2304140030_Kyocera-AVX-08055A151JAT2A_C2180927.pdf; ComponentLink2Description: JLCPCB Part URL; ComponentLink2URL: https://jlcpcb.com/partdetail/C2180927; ComponentLink3Description: LCSC Part URL; ComponentLink3URL: https://lcsc.com/product-detail/Multilayer-Ceramic-Capacitors-MLCC---SMD-SMT_Kyocera-AVX-Kyocera-AVX-08055A151JAT2A_C2180927.html
footprint CAP-0805 (0805 (2012M) Capacitor)
pins: 1, 2
